# Altium integrated library CapacitorElectrolytic.IntLib: 76 symbols
Pins are listed as number, name and electrical type; pins without a type are passive.

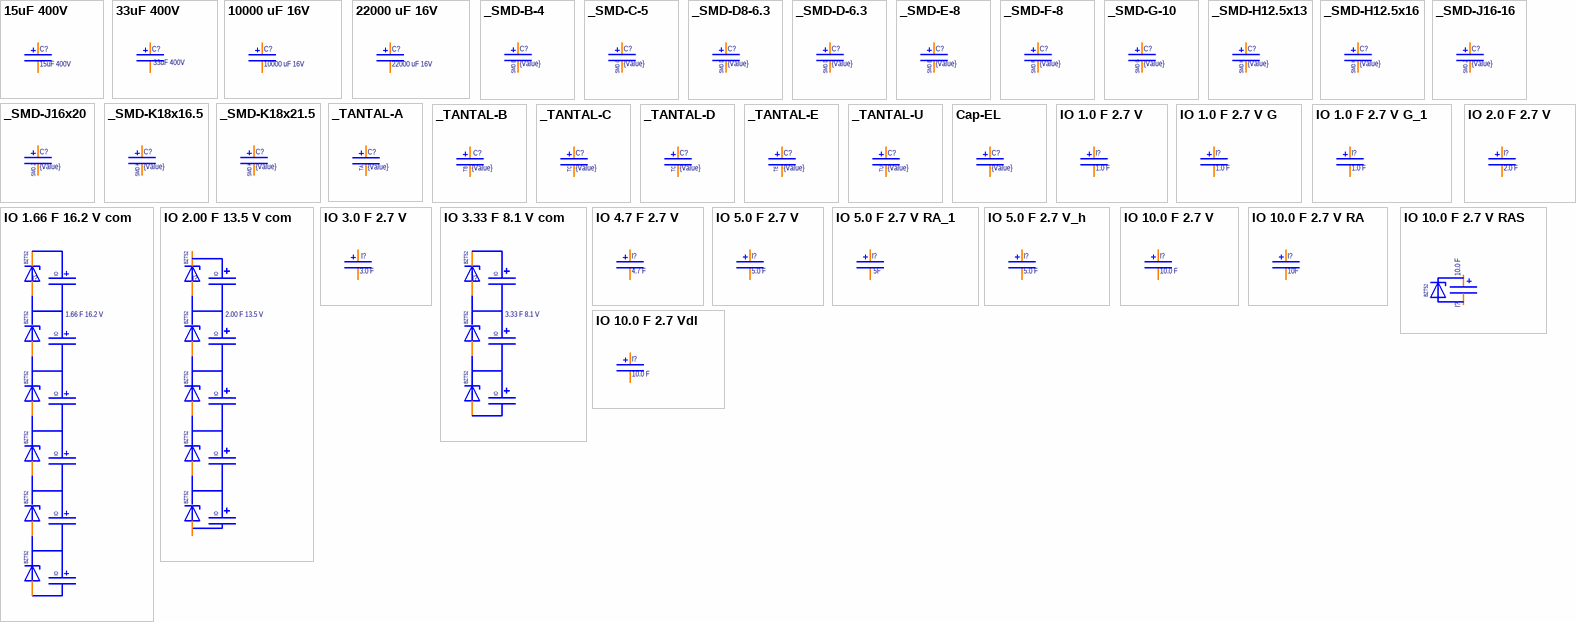
[diagram p0: symbols 15uF 400V to IO 10.0 F 2.7 Vdl]

## 15uF 400V
designator C?
10x16mm; Manufacturer: Guangdong TOPAZ Elec Tech; Manufacturer PartNumber: ECRE1016150M401P00; Temp.Characteristic: –55 °C to +105 °C; Tolerance: ±20 %; Note: Aluminum Electrolytic Capacitors; Detailed Description: Aluminum Electrolytic Capacitors - Leaded 15uF ±20% 400V Radial,10x16mm RoHS; Lifetime @ Temp: 2000Hrs@105℃; Package / Case: Radial,10x16mm; Publisher: Catcatcat Electronics; Voltage: 400V; HelpURL: https://datasheet.lcsc.com/szlcsc/Guangdong-TOPAZ-Elec-Tech-ECRE1016150M401P00_C156864.pdf; website developer: http://catcatcat.d-lan.dp.ua/; Dealer LCSC: https://lcsc.com/product-detail/Aluminum-Electrolytic-Capacitors-Leaded_Guangdong-TOPAZ-Elec-Tech-ECRE1016150M401P00_C156864.html; PartNumber LCSC: C156864; Pricing LCSC: 0.0854; Assembly type: Manual Part; Value: 15uF 400V
footprint Cap-EL(10x20_5-5)h
footprint Cap-EL(10x16.5_5-5)T
pins: 1, 2

## 33uF 400V
designator C?
13x25mm; Manufacturer: Hao Yin Electronic Technology Co., Ltd. (HY); Pricing Аlternative: 0.2695; Temp.Characteristic: –55 °C to +105 °C; Tolerance: ±20 %; Note: Aluminum Electrolytic Capacitors; Detailed Description: Aluminum Electrolytic Capacitors - Leaded 15uF ±20% 400V Radial,10x16mm RoHS; Lifetime @ Temp: 10000Hrs@105℃; Dealer Аlternative: https://voron.ua/catalog/025940--kondensator_hl_33uf_400v_1325_105c_10000hr_long_life_hy_hao_yin_electronic_techn; Package / Case: Radial,10x16mm; Publisher: Catcatcat Electronics; Voltage: 400V; website developer: http://catcatcat.d-lan.dp.ua/; Assembly type: Manual Part; PartNumber Аlternative: PartNumber Аlternative; Value: 33uF 400V
footprint Cap-EL(13x25-5)T
pins: 1, 2

## 10000 uF 16V
designator C?, comment value 10000 uF 16V  (hidden comment: 10000uFx16V)
18 x 35 mm; Temp.Characteristic: –55 °C to +105 °C; Tolerance: ±20 %; Voltage: 16 V; Note: Aluminum Electrolytic Capacitors; Lifetime @ Temp: 2000Hrs@105℃; Package / Case: 18 x 35 mm; Pricing Digi-Key: 1.07; Publisher: Catcatcat Electronics; website developer: http://catcatcat.d-lan.dp.ua/; Assembly type: Manual Part
footprint Cap-EL(18x35-7_5)
pins: 1, 2

## 22000 uF 16V
designator C?, comment value 22000 uF 16V  (hidden comment: 22000uFx16V)
22 x 40 mm; Temp.Characteristic: –55 °C to +105 °C; Tolerance: ±20 %; Voltage: 16 V; Note: Aluminum Electrolytic Capacitors; Lifetime @ Temp: 2000Hrs@105℃; Package / Case: 22 x 40 mm; Pricing Digi-Key: 1.07; Publisher: Catcatcat Electronics; website developer: http://catcatcat.d-lan.dp.ua/; Assembly type: Manual Part
footprint Cap-EL(22x40-10)
pins: 1, 2

## _SMD-B-4
designator C?  value {Value}  (hidden comment: *)
4x4.5, 5.3, 5.7, 5.8; Note: Aluminum Electrolytic Capacitors; Lifetime @ Temp: 2000Hrs@105℃; Publisher: Catcatcat Electronics; website developer: http://catcatcat.d-lan.dp.ua/; Assembly type: Manual Part
footprint SMD-B-4 (4?4.5, 5.3, 5.7, 5.8)
pins: 1, 2
text: SMD B

## _SMD-C-5
designator C?  value {Value}  (hidden comment: *)
5x4.0, 4.5, 5.3, 5.7, 5.8; Note: Aluminum Electrolytic Capacitors; Lifetime @ Temp: 2000Hrs@105℃; Publisher: Catcatcat Electronics; website developer: http://catcatcat.d-lan.dp.ua/; Assembly type: Manual Part
footprint SMD-C-5 (5?4.0, 4.5, 5.3, 5.7, 5.8)
pins: 1, 2
text: SMD C

## _SMD-D8-6.3
designator C?  value {Value}  (hidden comment: *)
6.3x7.7; Note: Aluminum Electrolytic Capacitors; Lifetime @ Temp: 2000Hrs@105℃; Publisher: Catcatcat Electronics; website developer: http://catcatcat.d-lan.dp.ua/; Assembly type: Manual Part
footprint SMD-D-6.3 (6.3?4.5, 5.3, 5.7, 5.8, 7.7)
pins: 1, 2
text: SMD D

## _SMD-D-6.3
designator C?  value {Value}  (hidden comment: *)
6.3x4.5, 5.3, 5.7, 5.8, 7.7; Note: Aluminum Electrolytic Capacitors; Lifetime @ Temp: 2000Hrs@105℃; Package / Case: SMD,6.3x5.4mm; Publisher: Catcatcat Electronics; website developer: http://catcatcat.d-lan.dp.ua/; Assembly type: Manual Part
footprint SMD-D-6.3 (6.3?4.5, 5.3, 5.7, 5.8, 7.7)
pins: 1, 2
text: SMD D

## _SMD-E-8
designator C?  value {Value}  (hidden comment: *)
8x6.5, 6.7, 7.7, 8.7; Note: Aluminum Electrolytic Capacitors; Lifetime @ Temp: 2000Hrs@105℃; Publisher: Catcatcat Electronics; website developer: http://catcatcat.d-lan.dp.ua/; Assembly type: Manual Part
footprint SMD-E-8X6.2 (8X6.5, 6.7, 7.7, 8.7, 10, 10.5)
pins: 1, 2
text: SMD E

## _SMD-F-8
designator C?  value {Value}  (hidden comment: *)
8x10, 10.5; Note: Aluminum Electrolytic Capacitors; Lifetime @ Temp: 2000Hrs@105℃; Publisher: Catcatcat Electronics; website developer: http://catcatcat.d-lan.dp.ua/; Assembly type: Manual Part
footprint SMD-F-8X10.2 (8X6.5, 6.7, 7.7, 8.7, 10, 10.5)
pins: 1, 2
text: SMD F

## _SMD-G-10
designator C?  value {Value}  (hidden comment: *)
10x7.7, 8.7, 10, 10.5, 12.5; Note: Aluminum Electrolytic Capacitors; Lifetime @ Temp: 2000Hrs@105℃; Publisher: Catcatcat Electronics; website developer: http://catcatcat.d-lan.dp.ua/; Assembly type: Manual Part
footprint SMD-G-10X10.2 (10X7.7, 8.7, 10, 10.5, 12.5)
pins: 1, 2
text: SMD G

## _SMD-H12.5x13
designator C?  value {Value}  (hidden comment: *)
12.5x13; Note: Aluminum Electrolytic Capacitors; Lifetime @ Temp: 2000Hrs@105℃; Publisher: Catcatcat Electronics; website developer: http://catcatcat.d-lan.dp.ua/; Assembly type: Manual Part
footprint SMD-H-12.5X13 (12.5X13.5)
pins: 1, 2
text: SMD H

## _SMD-H12.5x16
designator C?  value {Value}  (hidden comment: *)
12.5x16; Note: Aluminum Electrolytic Capacitors; Lifetime @ Temp: 2000Hrs@105℃; Publisher: Catcatcat Electronics; website developer: http://catcatcat.d-lan.dp.ua/; Assembly type: Manual Part
footprint SMD-H-12.5X16 (12.5X13.5)
pins: 1, 2
text: SMD H

## _SMD-J16-16
designator C?  value {Value}  (hidden comment: *)
16x16; Note: Aluminum Electrolytic Capacitors; Lifetime @ Temp: 2000Hrs@105℃; Publisher: Catcatcat Electronics; website developer: http://catcatcat.d-lan.dp.ua/; Assembly type: Manual Part
footprint SMD-J-16X16.5 (16X16.5)
pins: 1, 2
text: SMD J

## _SMD-J16x20
designator C?  value {Value}  (hidden comment: *)
16x20; Note: Aluminum Electrolytic Capacitors; Lifetime @ Temp: 2000Hrs@105℃; Publisher: Catcatcat Electronics; website developer: http://catcatcat.d-lan.dp.ua/; Assembly type: Manual Part
footprint SMD-J-16X20 (16X16.5)
pins: 1, 2
text: SMD J

## _SMD-K18x16.5
designator C?  value {Value}  (hidden comment: *)
18x16.5; Note: Aluminum Electrolytic Capacitors; Lifetime @ Temp: 2000Hrs@105℃; Publisher: Catcatcat Electronics; website developer: http://catcatcat.d-lan.dp.ua/; Assembly type: Manual Part
footprint SMD-K-18X16.5 (18X16.5)
pins: 1, 2
text: SMD K

## _SMD-K18x21.5
designator C?  value {Value}  (hidden comment: *)
18x21.5; Note: Aluminum Electrolytic Capacitors; Lifetime @ Temp: 2000Hrs@105℃; Publisher: Catcatcat Electronics; website developer: http://catcatcat.d-lan.dp.ua/; Assembly type: Manual Part
footprint SMD-K-18X21.5 (18X16.5)
pins: 1, 2
text: SMD K

## _TANTAL-A
designator C?, comment value {Value}  (hidden comment: uF ±10%)
Tolerance: ±20 %; Voltage: 6.3 Vdc; Note: Tantalum Capacitors; Lifetime @ Temp: 2000Hrs@105℃; ComponentLink1URL: http://www.samsungsem.com/global/support/product-search/index.jsp#; Package / Case: 2012 (0806) 3.2 x 1.6; Publisher: Catcatcat Electronics; website developer: http://catcatcat.d-lan.dp.ua/; Operating Temperature: -55℃~+125℃; Assembly type: Manual Part
footprint TANTAL_A
pins: 1, 2
text: TA

## _TANTAL-B
designator C?  value {Value}  (hidden comment: *)
Note: Tantalum Capacitors; Lifetime @ Temp: 2000Hrs@105℃; Publisher: Catcatcat Electronics; website developer: http://catcatcat.d-lan.dp.ua/; Assembly type: Manual Part
footprint TANTAL_B
pins: 1, 2
text: TB

## _TANTAL-C
designator C?  value {Value}  (hidden comment: *)
Note: Tantalum Capacitors; Lifetime @ Temp: 2000Hrs@105℃; Publisher: Catcatcat Electronics; website developer: http://catcatcat.d-lan.dp.ua/; Assembly type: Manual Part
footprint TANTAL_C
pins: 1, 2
text: TC

## _TANTAL-D
designator C?  value {Value}  (hidden comment: *)
Note: Tantalum Capacitors; Lifetime @ Temp: 2000Hrs@105℃; Publisher: Catcatcat Electronics; website developer: http://catcatcat.d-lan.dp.ua/; Assembly type: Manual Part
footprint TANTAL_D
pins: 1, 2
text: TC

## _TANTAL-E
designator C?  value {Value}  (hidden comment: *)
Note: Tantalum Capacitors; Lifetime @ Temp: 2000Hrs@105℃; Publisher: Catcatcat Electronics; website developer: http://catcatcat.d-lan.dp.ua/; Assembly type: Manual Part
footprint TANTAL_E
pins: 1, 2
text: TE

## _TANTAL-U
designator C?  value {Value}  (hidden comment: *)
Note: Tantalum Capacitors; Lifetime @ Temp: 2000Hrs@105℃; Publisher: Catcatcat Electronics; website developer: http://catcatcat.d-lan.dp.ua/; Assembly type: Manual Part
footprint TANTAL_U
pins: 1, 2
text: TU

## Cap-EL
designator C?  value {Value}  (hidden comment: *)
Note: Aluminum Electrolytic Capacitors; Lifetime @ Temp: 2000Hrs@105℃; Publisher: Catcatcat Electronics; website developer: http://catcatcat.d-lan.dp.ua/; Assembly type: Manual Part
footprint Cap-EL(4x6-1_5)T
footprint Cap-EL(6_3x11-2_5)
footprint Cap-EL(6_3x12-2_5)
footprint Cap-EL(8x11_5-3_5)
footprint Cap-EL(10x12-5)T
footprint Cap-EL(10x13_5-5)T
footprint Cap-EL(16x26-7_5)
footprint Cap-EL(13x25-5)T
footprint Cap-EL(18x25-7_5)
footprint Cap-EL(25x18-9)
pins: 1, 2

## IO 1.0 F 2.7 V
designator I?, comment value 1.0 F  (hidden comment: 1.0Fx2.7V)
8 x 13 mm; Temp.Characteristic: –55 °C to +105 °C; Tolerance: ±20 %; Voltage: 2.7 V; Note: Supercapacitor; Lifetime @ Temp: 2000Hrs@105℃; Package / Case: 8 x 13 mm; Pricing Digi-Key: 0.286; Publisher: Catcatcat Electronics; website developer: http://catcatcat.d-lan.dp.ua/; Assembly type: Manual Part
footprint Cap-EL(8x14-3_5)
pins: 1, 2

## IO 1.0 F 2.7 V G
designator I?, comment value 1.0 F  (hidden comment: 1.0Fx2.7V)
8 x 13 mm; Temp.Characteristic: –55 °C to +105 °C; Tolerance: ±20 %; Voltage: 2.7 V; Note: Supercapacitor; Lifetime @ Temp: 2000Hrs@105℃; Package / Case: 8 x 13 mm; Pricing Digi-Key: 0.286; Publisher: Catcatcat Electronics; website developer: http://catcatcat.d-lan.dp.ua/; Assembly type: Manual Part
footprint Cap-EL_G_(8.0x11.5-3.5)
pins: 1, 2

## IO 1.0 F 2.7 V G_1
designator I?, comment value 1.0 F  (hidden comment: 1.0Fx2.7V)
8 x 14 mm; Temp.Characteristic: –55 °C to +105 °C; Tolerance: ±20 %; Voltage: 2.7 V; Note: Supercapacitor; Lifetime @ Temp: 2000Hrs@105℃; Package / Case: 8 x 13 mm; Pricing Digi-Key: 0.286; Publisher: Catcatcat Electronics; website developer: http://catcatcat.d-lan.dp.ua/; Assembly type: Manual Part
footprint Cap-EL_G_(8.0x14.5-3.5) - REVERS
pins: 1, 2

## IO 1.66 F 16.2 V com
designator I?  value 1.66 F 16.2 V  (hidden comment: *)
3*3-10 x 30 mm; Temp.Characteristic: –55 °C to +105 °C; Tolerance: ±20 %; Voltage: 2.7 V; Note: Supercapacitor; Lifetime @ Temp: 2000Hrs@105℃; Package / Case: 10 x 26 mm; Pricing Digi-Key: 0.638; Publisher: Catcatcat Electronics; website developer: http://catcatcat.d-lan.dp.ua/; Assembly type: Manual Part
footprint IO 1.66 F 16.2 V com
pins: 1, 2, 3, 4, 5, 6, 7
text: BZT52; IO

## IO 2.0 F 2.7 V
designator I?, comment value 2.0 F  (hidden comment: 2.0Fx2.7V)
8 x 13 mm; Temp.Characteristic: –55 °C to +105 °C; Tolerance: ±20 %; Voltage: 2.7 V; Note: Supercapacitor; Lifetime @ Temp: 2000Hrs@105℃; Package / Case: 8 x 13 mm; Pricing Digi-Key: 0.319; Publisher: Catcatcat Electronics; website developer: http://catcatcat.d-lan.dp.ua/; Assembly type: Manual Part
footprint Cap-EL(8x14-3_5)
pins: 1, 2

## IO 2.00 F 13.5 V com
designator I?  value 2.00 F 13.5 V  (hidden comment: *)
3*3-10 x 30 mm; Temp.Characteristic: –55 °C to +105 °C; Tolerance: ±20 %; Voltage: 2.7 V; Note: Supercapacitor; Lifetime @ Temp: 2000Hrs@105℃; Package / Case: 10 x 26 mm; Pricing Digi-Key: 0.638; Publisher: Catcatcat Electronics; website developer: http://catcatcat.d-lan.dp.ua/; Assembly type: Manual Part
footprint IO 2.0 F 13.5 V com
pins: 1, 2, 3, 4, 5, 6
text: BZT52; IO

## IO 3.0 F 2.7 V
designator I?, comment value 3.0 F  (hidden comment: 3.0Fx2.7V)
8 x 20 mm; Temp.Characteristic: –55 °C to +105 °C; Tolerance: ±20 %; Voltage: 2.7 V; Note: Supercapacitor; Lifetime @ Temp: 2000Hrs@105℃; Package / Case: 8 x 20 mm; Pricing Digi-Key: 0.3575; Publisher: Catcatcat Electronics; website developer: http://catcatcat.d-lan.dp.ua/; Assembly type: Manual Part
footprint Cap-EL(8x16-3_5)
pins: 1, 2

## IO 3.33 F 8.1 V com
designator I?  value 3.33 F 8.1 V  (hidden comment: *)
3*3-10 x 30 mm; Temp.Characteristic: –55 °C to +105 °C; Tolerance: ±20 %; Voltage: 2.7 V; Note: Supercapacitor; Lifetime @ Temp: 2000Hrs@105℃; Package / Case: 10 x 26 mm; Pricing Digi-Key: 0.638; Publisher: Catcatcat Electronics; website developer: http://catcatcat.d-lan.dp.ua/; Assembly type: Manual Part
footprint IO 3.33 F 8.1 V com
pins: 1, 2, 3, 4
text: BZT52; IO

## IO 4.7 F 2.7 V
designator I?  value 4.7 F  (hidden comment: *)
10 x 20 mm; Temp.Characteristic: –55 °C to +105 °C; Tolerance: ±20 %; Voltage: 2.7 V; Note: Supercapacitor; Lifetime @ Temp: 2000Hrs@105℃; Package / Case: 10 x 20 mm; Pricing Digi-Key: 0.39; Publisher: Catcatcat Electronics; website developer: http://catcatcat.d-lan.dp.ua/; Assembly type: Manual Part
footprint Cap-EL(10x20_5-5)
pins: 1, 2

## IO 5.0 F 2.7 V
designator I?  value 5.0 F  (hidden comment: *)
10 x 21 mm,PowerStar,SeriesHV; Pricing Аlternative: 0.29; Temp.Characteristic: –55 °C to +105 °C; Tolerance: ±20 %; Voltage: 2.7 V; Note: szkfd1@qq.com(344353244), http://344353244.qzone.qq.com,; Lifetime @ Temp: 2000Hrs@105℃; Dealer Digi-Key: https://detail.1688.com/offer/1191580488.html; Package / Case: 10 x 20 mm; Publisher: Catcatcat Electronics; website developer: http://catcatcat.d-lan.dp.ua/; Assembly type: Manual Part
footprint Cap-EL(10x20_5-5)
pins: 1, 2

## IO 5.0 F 2.7 V RA_1
designator I?  value 5F  (hidden comment: *)
AVX 5F -10% +30% 2.7V T/H; Manufacturer: AVX Corporation; Manufacturer PartNumber: SCCS20B505PRB; Temp.Characteristic: -40°C ~ 65°C; Tolerance: -10%, +30%; Note: Supercapacitor; Detailed Description: 5F (EDLC) Supercapacitor 2.7V Radial, Can 70 mOhm @ 1kHz 1000 Hrs @ 60°C; Lifetime @ Temp: 2000Hrs@105℃; Package / Case: 10 x 26 mm; Pricing Digi-Key: 2.28000; Publisher: Catcatcat Electronics; Voltage: 2.7 V; HelpURL: http://datasheets.avx.com/AVX-SCC-LE.pdf; website developer: http://catcatcat.d-lan.dp.ua/; PartNumber Digi-Key: SCCS20B505PRB; Assembly type: Manual Part
footprint Cap-EL(10x20_5-5)h
pins: 1, 2

## IO 5.0 F 2.7 V_h
designator I?  value 5.0 F  (hidden comment: *)
10 x 21 mm,PowerStar,SeriesHV; Pricing Аlternative: 0.29; Temp.Characteristic: –55 °C to +105 °C; Tolerance: ±20 %; Voltage: 2.7 V; Note: szkfd1@qq.com(344353244), http://344353244.qzone.qq.com,; Lifetime @ Temp: 2000Hrs@105℃; Dealer Digi-Key: https://detail.1688.com/offer/1191580488.html; Package / Case: 10 x 20 mm; Publisher: Catcatcat Electronics; website developer: http://catcatcat.d-lan.dp.ua/; Assembly type: Manual Part
footprint Cap-EL(10x20_5-5)h
pins: 1, 2

## IO 10.0 F 2.7 V
designator I?  value 10.0 F  (hidden comment: *)
10 x 26 mm; Temp.Characteristic: –55 °C to +105 °C; Tolerance: ±20 %; Voltage: 2.7 V; Note: Supercapacitor; Lifetime @ Temp: 2000Hrs@105℃; Package / Case: 10 x 26 mm; Pricing Digi-Key: 0.638; Publisher: Catcatcat Electronics; website developer: http://catcatcat.d-lan.dp.ua/; Assembly type: Manual Part
footprint Cap-EL(10x25_5-5)
pins: 1, 2

## IO 10.0 F 2.7 V RA
designator I?  value 10F  (hidden comment: *)
AVX 10F -10% +30% 2.7V T/H; Manufacturer: AVX Corporation; Manufacturer PartNumber: SCCT20B106PRB; Temp.Characteristic: -40°C ~ 65°C; Tolerance: -10%, +30%; Note: Supercapacitor; Detailed Description: 10F (EDLC) Supercapacitor 2.7V Radial, Can 50 mOhm @ 1kHz 1000 Hrs @ 60°C; Lifetime @ Temp: 2000Hrs@105℃; Package / Case: 10 x 26 mm; Pricing Digi-Key: 3.26000; Publisher: Catcatcat Electronics; Voltage: 2.7 V; HelpURL: http://datasheets.avx.com/AVX-SCC.pdf; website developer: http://catcatcat.d-lan.dp.ua/; PartNumber Digi-Key: SCCT20B106PRB; Assembly type: Manual Part
footprint Cap-EL(12.5x20.0x5.00)RA
pins: 1, 2

## IO 10.0 F 2.7 V RAS
designator I?  value 10.0 F  (hidden comment: *)
12.5 x 20 mm; Temp.Characteristic: –55 °C to +105 °C; Tolerance: ±20 %; Voltage: 2.7 V; Note: Supercapacitor; Lifetime @ Temp: 2000Hrs@105℃; Package / Case: 10 x 26 mm; Pricing Digi-Key: 0.638; Publisher: Catcatcat Electronics; website developer: http://catcatcat.d-lan.dp.ua/; Assembly type: Manual Part
footprint Cap-EL(12.5x20.50x5.00)h
footprint Cap-EL(12.5x20.50x5.00)h R
pins: 1, 2
text: BZT52

## IO 10.0 F 2.7 Vdl
designator I?  value 10.0 F  (hidden comment: *)
10 x 30 mm; Temp.Characteristic: –55 °C to +105 °C; Tolerance: ±20 %; Voltage: 2.7 V; Note: Supercapacitor; Lifetime @ Temp: 2000Hrs@105℃; Package / Case: 10 x 26 mm; Pricing Digi-Key: 0.638; Publisher: Catcatcat Electronics; website developer: http://catcatcat.d-lan.dp.ua/; Assembly type: Manual Part
footprint Cap-EL(10x30_5-5)h
pins: 1, 2

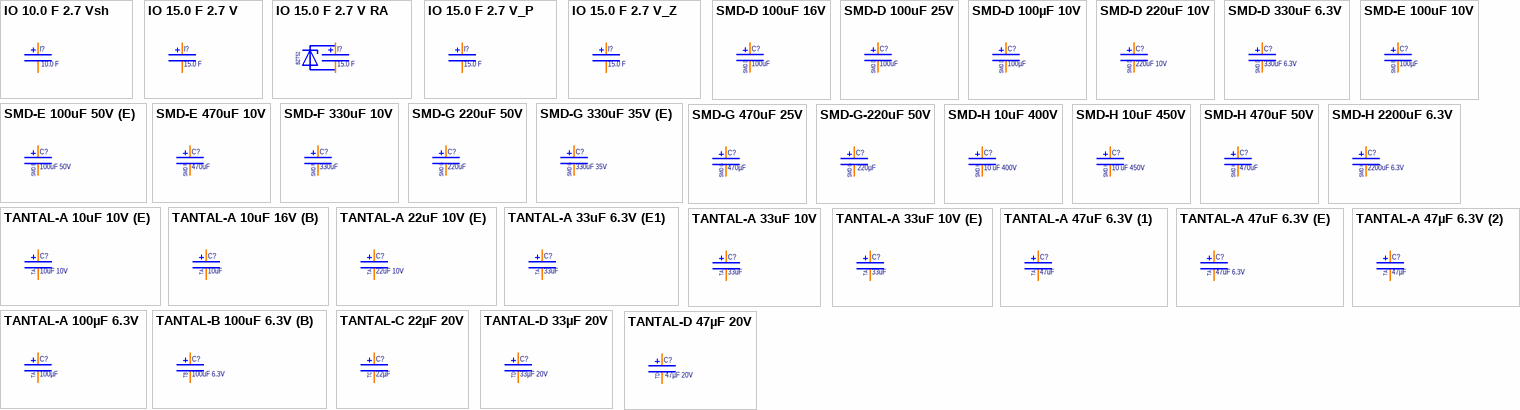
[diagram p1: symbols IO 10.0 F 2.7 Vsh to TANTAL-D 47µF 20V]

## IO 10.0 F 2.7 Vsh
designator I?  value 10.0 F  (hidden comment: *)
12.5 x 20 mm; Temp.Characteristic: –55 °C to +105 °C; Tolerance: ±20 %; Voltage: 2.7 V; Note: Supercapacitor; Lifetime @ Temp: 2000Hrs@105℃; Package / Case: 10 x 26 mm; Pricing Digi-Key: 0.638; Publisher: Catcatcat Electronics; website developer: http://catcatcat.d-lan.dp.ua/; Assembly type: Manual Part
footprint Cap-EL(12.5x20-5)
pins: 1, 2

## IO 15.0 F 2.7 V
designator I?  value 15.0 F  (hidden comment: *)
12.5 x 27 mm; Temp.Characteristic: –55 °C to +105 °C; Tolerance: ±20 %; Voltage: 2.7 V; Note: Supercapacitor; Lifetime @ Temp: 2000Hrs@105℃; Package / Case: 12.5 x 27 mm; Pricing Digi-Key: 0.781; website developer: http://catcatcat.d-lan.dp.ua/; Assembly type: Manual Part; Publisher: Catcatcat Electronics
footprint Cap-EL(12.5x25-5)
pins: 1, 2

## IO 15.0 F 2.7 V RA
designator I?  value 15.0 F  (hidden comment: *)
12.5 x 20 mm; Temp.Characteristic: –55 °C to +105 °C; Tolerance: ±20 %; Voltage: 2.7 V; Note: Supercapacitor; Lifetime @ Temp: 2000Hrs@105℃; Package / Case: 10 x 26 mm; Pricing Digi-Key: 0.638; Publisher: Catcatcat Electronics; website developer: http://catcatcat.d-lan.dp.ua/; Assembly type: Manual Part
footprint Cap-EL(12.5x20.50x5.00)h
footprint Cap-EL(12.5x20.50x5.00)h R
pins: 1, 2
text: BZT52

## IO 15.0 F 2.7 V_P
designator I?  value 15.0 F  (hidden comment: *)
13 x 27 mm,PowerStar,SeriesHV; Pricing Аlternative: 0.44; Temp.Characteristic: –55 °C to +105 °C; Tolerance: ±20 %; Voltage: 2.7 V; Note: szkfd1@qq.com(344353244),http://344353244.qzone.qq.com,344353244@qq.com; Lifetime @ Temp: 2000Hrs@105℃; Dealer Аlternative: https://detail.1688.com/offer/1191580488.html; Package / Case: 12.5 x 27 mm; Pricing Digi-Key: 0.781; Publisher: Catcatcat Electronics; website developer: http://catcatcat.d-lan.dp.ua/; Assembly type: Manual Part
footprint Cap-EL(12.5x25-5)
pins: 1, 2

## IO 15.0 F 2.7 V_Z
designator I?  value 15.0 F  (hidden comment: *)
13 x 29 mm,PowerStar,SeriesHV; Pricing Аlternative: 0.44; Temp.Characteristic: –55 °C to +105 °C; Tolerance: ±20 %; Voltage: 2.7 V; Note: szkfd1@qq.com(344353244),http://344353244.qzone.qq.com,344353244@qq.com; Lifetime @ Temp: 2000Hrs@105℃; Dealer Аlternative: https://detail.1688.com/offer/1191580488.html; Package / Case: 13.0 x 29 mm; Pricing Digi-Key: 0.781; Publisher: Catcatcat Electronics; website developer: http://catcatcat.d-lan.dp.ua/; Assembly type: Manual Part
footprint Cap-EL(13x29-5)T
pins: 1, 2

## SMD-D 100uF 16V
designator C?, comment value 100uF  (hidden comment: 100uF 16V)
6.3x5.4mm 2000Hrs@105℃; Manufacturer: ROQANG; Manufacturer PartNumber: RT1C101M0605; Tolerance: ±20%; Note: Aluminum Electrolytic Capacitors; Detailed Description: Aluminum Electrolytic Capacitors - SMD 100uF ±20% 16V SMD,6.3x5.4mm RoHS; Package / Case: SMD,6.3x5.4mm; Publisher: Catcatcat Electronics; Voltage: 16V; HelpURL: https://datasheet.lcsc.com/szlcsc/ROQANG-RT1C101M0605_C267461.pdf; website developer: http://catcatcat.d-lan.dp.ua/; Dealer LCSC: https://lcsc.com/product-detail/Others_ROQANG-RT1C101M0605_C267461.html; Lifetime @ Temp: 2000Hrs@105℃; Operating Temperature: -40℃~+105℃; PartNumber LCSC: C267461; Pricing LCSC: 0.0303; Assembly type: Manual Part
footprint SMD-D-6.3 (6.3?4.5, 5.3, 5.7, 5.8, 7.7)
pins: 1, 2
text: SMD D

## SMD-D 100uF 25V
designator C?, comment value 100uF  (hidden comment: 100uF 25V)
6.3x7.7mm 4000Hrs@125℃; Manufacturer: PANASONIC; Manufacturer PartNumber: EEHZC1E101XP; Tolerance: ±20%; Note: Aluminum Electrolytic Capacitors; Detailed Description: Aluminum Electrolytic Capacitors - SMD 100uF ±20% 25V SMD,6.3x7.7mm RoHS; Package / Case: SMD,6.3x7.7mm; Publisher: Catcatcat Electronics; Voltage: 25V; HelpURL: https://datasheet.lcsc.com/szlcsc/PANASONIC-EEHZC1E101XP_C178640.pdf; website developer: http://catcatcat.d-lan.dp.ua/; Dealer LCSC: https://lcsc.com/product-detail/Aluminum-Electrolytic-Capacitors-SMD_PANASONIC-EEHZC1E101XP_C178640.html; Lifetime @ Temp: 4000Hrs@125℃; Operating Temperature: -55℃~+125℃; PartNumber LCSC: C178640; Pricing LCSC: 0.4879; Assembly type: Manual Part
footprint SMD-D-6.3 (6.3?4.5, 5.3, 5.7, 5.8, 7.7)
pins: 1, 2
text: SMD D

## SMD-D 100µF 10V
designator C?, comment value 100µF  (hidden comment: 100µF 10V)
CAP ALUM 100UF 20% 10V SMD; Manufacturer: KEMET; Manufacturer PartNumber: EDK107M010A9GAA; Temp.Characteristic: -40°C ~ 85°C; Note: Aluminum Electrolytic Capacitors; Detailed Description: 100µF 10V Aluminum Electrolytic Capacitors Radial, Can - SMD  2000 Hrs @ 85°C; Lifetime @ Temp: 2000Hrs@105℃; Dealer Digi-Key: https://www.digikey.com/product-detail/en/kemet/EDK107M010A9GAA/EDK107M010A9GAA-ND/6597387; Package / Case: D, 0.260" L x 0.260" W (6.60mm x 6.60mm); Publisher: Catcatcat Electronics; Tolerance: ±20%; Voltage: 10V; HelpURL: https://api.kemet.com/component-edge/download/datasheet/EDK107M010A9GAA.pdf; website developer: http://catcatcat.d-lan.dp.ua/; PartNumber Digi-Key: EDK107M010A9GAA; Assembly type: Manual Part
footprint SMD-D-6.3 (6.3X4.5, 5.3, 5.7, 5.8, 7.7)
pins: 1, 2
text: SMD D

## SMD-D 220uF 10V
designator C?, comment 220uF 10V
6.3x4.5, 5.3, 5.7, 5.8, 7.7; Manufacturer: Shenzhen Xin Tang Electronic Technology Co., Ltd (Xin Tang); PartNumber Аlternative: 030456; Dealer Аlternative: voron.ua; Pricing Аlternative: 0.045; Note: Aluminum Electrolytic Capacitors; Lifetime @ Temp: 2000Hrs@105℃; Package / Case: SMD,6.3x5.4mm; Publisher: Catcatcat Electronics; website developer: http://catcatcat.d-lan.dp.ua/; Assembly type: Manual Part; Value: 220uF 10V
footprint SMD-D-6.3 (6.3?4.5, 5.3, 5.7, 5.8, 7.7)
pins: 1, 2
text: SMD D

## SMD-D 330uF 6.3V
designator C?  value 330uF 6.3V  (hidden comment: *)
6.3x7.7 6V3 105C SMD; Manufacturer PartNumber: SA1 330uF 6.3V; PartNumber Аlternative: 019861; Pricing Аlternative: 0.055; Note: Aluminum Electrolytic Capacitors; Detailed Description: RVT 330uF 6V3 6*7 105C SMD; Lifetime @ Temp: 2000Hrs@105℃; Dealer Аlternative: https://voron.ua/catalog/019861--kondensator_rvt_330uf_6v3_67_105c_smd_jp_shanghai_jinpei_electronic_coltd; Package / Case: SMD,6.3x5.4mm; Publisher: Catcatcat Electronics; HelpURL: https://pdf.voron.ua/files/pdf/cap/SMD-Aluminum-Electrolytic-Capacitor-SA1.pdf; website developer: http://catcatcat.d-lan.dp.ua/; Assembly type: Manual Part
footprint SMD-D8-6.3X7.7 (6.3X4.5, 5.3, 5.7, 5.8, 7.7)
pins: 1, 2
text: SMD D

## SMD-E 100uF 10V
designator C?, comment value 100µF  (hidden comment: 100uF 10V)
8x6.5 100UF 20% 10V SMD; Manufacturer: Panasonic Electronic Components; Manufacturer PartNumber: EEE-FC1A101P; Temp.Characteristic: -40°C ~ 105°C; Note: Aluminum Electrolytic Capacitors; Detailed Description: 100µF 10V Aluminum Electrolytic Capacitors Radial, Can - SMD  1000 Hrs @ 105°C; Lifetime @ Temp: 2000Hrs@105℃; Dealer Digi-Key: https://www.digikey.com/product-detail/en/panasonic-electronic-components/EEE-FC1A101P/PCE3989TR-ND/817398; Package / Case: F, 0.327" L x 0.327" W (8.30mm x 8.30mm); Publisher: Catcatcat Electronics; Tolerance: ±20%; Voltage: 10V; HelpURL: https://industrial.panasonic.com/cdbs/www-data/pdf/RDE0000/ABA0000C1172.pdf; website developer: http://catcatcat.d-lan.dp.ua/; PartNumber Digi-Key: EEE-FC1A101P; Assembly type: Manual Part
footprint SMD-E-8X6.2 (8X6.5, 6.7, 7.7, 8.7, 10, 10.5)
pins: 1, 2
text: SMD E

## SMD-E 100uF 50V (E)
designator C?, comment value 100uF 50V  (hidden comment: 100uF 50V ±20%)
8x10 ±20%; Manufacturer: Lelon; Manufacturer PartNumber: VEJ101M1HTR-0810; Note: Aluminum Electrolytic Capacitors; Detailed Description: ALUMINUM ELECTROLYTIC CAPACITORS - SMD 100UF ±20% 50V SMD,8X10MM ROHS; Lifetime @ Temp: 2000Hrs@105℃; Package / Case: SMD-ECAP-8x10; Publisher: Catcatcat Electronics; Voltage: 50V; HelpURL: https://datasheet.lcsc.com/szlcsc/Lelon-VEJ101M1HTR-0810_C176665.pdf; website developer: http://catcatcat.d-lan.dp.ua/; PartNumber LCSC: C176665; Pricing LCSC: 0.0942; Assembly type: Extended Part
footprint SMD-E-8X6.2 (8X6.5, 6.7, 7.7, 8.7, 10, 10.5)
pins: 1, 2
text: SMD E

## SMD-E 470uF 10V
designator C?, comment value 470uF  (hidden comment: 470uF 10V)
8x10.2; Pricing Аlternative: 0.036; Temp.Characteristic: –55 °C to +105 °C; Tolerance: ±20 %; Note: Aluminum Electrolytic Capacitors; Lifetime @ Temp: 2000Hrs@105℃; Package / Case: F; Pricing Digi-Key: 0.155; Publisher: Catcatcat Electronics; Voltage: 10V; website developer: http://catcatcat.d-lan.dp.ua/; PartNumber Digi-Key: EEEFK1A471P; Assembly type: Manual Part
footprint SMD-E-8X6.2 (8X6.5, 6.7, 7.7, 8.7, 10, 10.5)
pins: 1, 2
text: SMD F

## SMD-F 330uF 10V
designator C?, comment value 330uF  (hidden comment: 330uF 10V)
8x10mm 5000Hrs @ 105℃; Manufacturer: Lelon; Manufacturer PartNumber: VZH331M1ATR-0810; Tolerance: ±20%; Note: Aluminum Electrolytic Capacitors; Marking: 330; Detailed Description: 330uF ±20% 10V SMD,8x10mm Aluminum Electrolytic Capacitors - SMD RoHS; Package / Case: SMD,8x10mm; Publisher: Catcatcat Electronics; Voltage: 10V; HelpURL: https://datasheet.lcsc.com/szlcsc/1910111742_Lelon-VZH331M1ATR-0810_C249903.pdf; website developer: http://catcatcat.d-lan.dp.ua/; Dealer LCSC: https://lcsc.com/product-detail/Others_Lelon-VZH331M1A0810-TRO_C249903.html; Lifetime @ Temp: 5000Hrs @ 105℃; Operating Temperature: -45℃ ~ +105℃; PartNumber LCSC: C249903; Pricing LCSC: 0.0935; Assembly type: Manual Part
footprint SMD-F-8X10.2 (8X6.5, 6.7, 7.7, 8.7, 10, 10.5)
pins: 1, 2
text: SMD F

## SMD-G 220uF 50V
designator C?, comment value 220uF  (hidden comment: 220uF 50V)
10x10mm 2000Hrs@105℃; Manufacturer: Lelon; Manufacturer PartNumber: VEJ221M1HTR-1010; Tolerance: ±20%; Note: Aluminum Electrolytic Capacitors; Detailed Description: Aluminum Electrolytic Capacitors - SMD 220uF ±20% 50V SMD,10x10mm RoHS; Package / Case: SMD,10x10mm; Publisher: Catcatcat Electronics; Voltage: 50V; HelpURL: https://datasheet.lcsc.com/szlcsc/Lelon-VEJ221M1HTR-1010_C176670.pdf; website developer: http://catcatcat.d-lan.dp.ua/; Dealer LCSC: https://lcsc.com/product-detail/Aluminum-Electrolytic-Capacitors-SMD_Lelon-VEJ221M1HTR-1010_C176670.html; Lifetime @ Temp: 2000Hrs@105℃; Operating Temperature: -55℃~+105℃; PartNumber LCSC: C176670; Pricing LCSC: 0.1530; Assembly type: Manual Part
footprint SMD-G-10X10.2 (10X7.7, 8.7, 10, 10.5, 12.5)
pins: 1, 2
text: SMD G

## SMD-G 330uF 35V (E)
designator C?, comment value 330uF 35V  (hidden comment: 330uF 35V ±20%)
10x7.7, 8.7, 10, 10.5, 12.5 ±20%; Manufacturer: Lelon; Manufacturer PartNumber: VZH331M1VTR-1010K; Note: Aluminum Electrolytic Capacitors; Lifetime @ Temp: 2000Hrs@105℃; Package / Case: SMD-ECAP-10x10; Publisher: Catcatcat Electronics; Tolerance: ±20%; Voltage: 35V; HelpURL: https://datasheet.lcsc.com/szlcsc/Lelon-VZH331M1VTR-1010K_C134522.pdf; website developer: http://catcatcat.d-lan.dp.ua/; PartNumber LCSC: C134522; Pricing LCSC: 0.2319; Assembly type: Manual Part
footprint SMD-G-10X10.2 (10X7.7, 8.7, 10, 10.5, 12.5)
pins: 1, 2
text: SMD G

## SMD-G 470uF 25V
designator C?, comment value 470µF  (hidden comment: 470uF 25V)
CAP ALUM 470UF 20% 25V SMD; Manufacturer: KEMET; Manufacturer PartNumber: EDH477M025A9PAA; Pricing Аlternative: 0.05; Temp.Characteristic: –55 °C to +105 °C; Note: Aluminum Electrolytic Capacitors; Detailed Description: 470µF 25V Aluminum Electrolytic Capacitors Radial, Can - SMD  2000 Hrs @ 105°C; Lifetime @ Temp: 2000Hrs@105℃; ComponentLink2URL: http://www.mouser.com/ds/2/315/ABA0000C1181-947564.pdf; Dealer Digi-Key: https://www.digikey.com/product-detail/en/kemet/EDH477M025A9PAA/EDH477M025A9PAA-ND/6597660; Dealer Аlternative: https://detail.1688.com/offer/541866342432.html; Package / Case: G, 0.394" Dia (10.00mm); Pricing Digi-Key: 0.21; Publisher: Catcatcat Electronics; Tolerance: ±20 %; Voltage: 25V; HelpURL: https://api.kemet.com/component-edge/download/datasheet/EDH477M025A9PAA.pdf; website developer: http://catcatcat.d-lan.dp.ua/; PartNumber Digi-Key: EDH477M025A9PAA; Assembly type: Manual Part
footprint SMD-G-10X10.2 (10X7.7, 8.7, 10, 10.5, 12.5)
pins: 1, 2
text: SMD G

## SMD-G-220uF 50V
designator C?, comment value 220µF  (hidden comment: 220uF 50V)
CAP ALUM 220UF 20% 50V SMD; Manufacturer: Panasonic Electronic Components; Manufacturer PartNumber: EEE-1HA221P; Temp.Characteristic: -40°C ~ 85°C; Note: Aluminum Electrolytic Capacitors; Detailed Description: 220µF 50V Aluminum Electrolytic Capacitors Radial, Can - SMD  2000 Hrs @ 85°C; Lifetime @ Temp: 2000Hrs@105℃; Dealer Digi-Key: https://www.digikey.com/product-detail/en/panasonic-electronic-components/ECE-V1HA221P/PCE3198TR-ND/273829; Package / Case: G, 0.406" L x 0.406" W (10.30mm x 10.30mm); Pricing Digi-Key: 0.65000; Publisher: Catcatcat Electronics; Tolerance: ±20%; Voltage: 50V; HelpURL: https://media.digikey.com/pdf/Data%20Sheets/Panasonic%20Electronic%20Components/S_Series_Type_V_.pdf; website developer: http://catcatcat.d-lan.dp.ua/; PartNumber Digi-Key: EEE-1HA221P; Assembly type: Manual Part
footprint SMD-G-10X10.2 (10X7.7, 8.7, 10, 10.5, 12.5)
pins: 1, 2
text: SMD G

## SMD-H 10uF 400V
designator C?, comment value 10 uF 400V  (hidden comment: 10uF 400V)
400V 10.0*12.0 105C SMD; Manufacturer: Semtech; Manufacturer PartNumber: HU2G100M-CRG12; Tolerance: ±20%; Note: Aluminum Electrolytic Capacitors; Detailed Description: Aluminum Electrolytic Capacitors - SMD 10uF ±20% 400V SMD,10x12.5mm RoHS; Lifetime @ Temp: 2000Hrs@105℃; Package / Case: SMD,10x12.5mm; Publisher: Catcatcat Electronics; Voltage: 400V; HelpURL: https://datasheet.lcsc.com/szlcsc/Semtech-HU2G100M-CRG12_C117830.pdf; website developer: http://catcatcat.d-lan.dp.ua/; Dealer LCSC: https://lcsc.com/product-detail/Aluminum-Electrolytic-Capacitors-SMD_10uF-400V_C117830.html; PartNumber LCSC: C117830; Pricing LCSC: 0.1267; Assembly type: Manual Part
footprint SMD-G-10X10.2 (10X7.7, 8.7, 10, 10.5, 12.5)
pins: 1, 2
text: SMD H

## SMD-H 10uF 450V
designator C?, comment value 10 uF 450V  (hidden comment: 10uF 450V)
450V 12.5*13.5 105C SMD; Manufacturer: Semtech; Manufacturer PartNumber: HU2G100M-CRG12; Tolerance: ±20%; Voltage: 400V; Note: Aluminum Electrolytic Capacitors; Detailed Description: Aluminum Electrolytic Capacitors - SMD 15uF ±20% 400V SMD,12.5x13.5mm RoHS; Lifetime @ Temp: 3000Hrs@105℃; Package / Case: SMD,12.5x13.5mm; Publisher: Catcatcat Electronics; HelpURL: https://datasheet.lcsc.com/szlcsc/Honor-Elec-UV2G150M1213_C88688.pdf; website developer: http://catcatcat.d-lan.dp.ua/; Dealer LCSC: https://lcsc.com/product-detail/Aluminum-Electrolytic-Capacitors-SMD_10uF-400V_C117830.html; PartNumber LCSC: C88688; Pricing LCSC: 0.2364; Assembly type: Manual Part
footprint SMD-H-12.5X13 (12.5X13.5)
pins: 1, 2
text: SMD H

## SMD-H 470uF 50V
designator C?, comment value 470uF  (hidden comment: 470uF 50V 12.5x13.5mm)
50V 12.5x13.5mm 2000Hrs@105℃; Manufacturer: ROQANG; Manufacturer PartNumber: RVT1H471M1213; Tolerance: ±20%; Note: Aluminum Electrolytic Capacitors; Detailed Description: Aluminum Electrolytic Capacitors - SMD 470uF ±20% 50V SMD,12.5x13.5mm RoHS; Package / Case: SMD,12.5x13.5mm; Publisher: Catcatcat Electronics; Voltage: 50V; HelpURL: https://datasheet.lcsc.com/szlcsc/ROQANG-RVT1H471M1213_C90272.pdf; website developer: http://catcatcat.d-lan.dp.ua/; Dealer LCSC: https://lcsc.com/product-detail/Aluminum-Electrolytic-Capacitors-SMD_470uF-50V-20_C90272.html; Lifetime @ Temp: 2000Hrs@105℃; Operating Temperature: -55℃~+105℃; PartNumber LCSC: C90272; Pricing LCSC: 0.2773; Assembly type: Manual Part
footprint SMD-H-12.5X13 (12.5X13.5)
pins: 1, 2
text: SMD H

## SMD-H 2200uF 6.3V
designator C?  value 2200uF 6.3V  (hidden comment: *)
12.5x13; Note: Aluminum Electrolytic Capacitors; Lifetime @ Temp: 2000Hrs@105℃; Publisher: Catcatcat Electronics; website developer: http://catcatcat.d-lan.dp.ua/; Assembly type: Manual Part
footprint SMD-H-12.5X13 (12.5X13.5)
pins: 1, 2
text: SMD H

## TANTAL-A 10uF 10V (E)
designator C?, comment value 10uF 10V  (hidden comment: 10uF ±10% 10V)
10uF 10V CASE-A_3216; Manufacturer: Shenzhen Zhenhua XinYun Elec; Manufacturer PartNumber: CA45-A-10V-10uF-M; Tolerance: ±20 %; Voltage: 10 Vdc; Note: Tantalum Capacitors; Detailed Description: Tantalum Capacitors 10uF 10V CASE-A_3216 RoHS; Lifetime @ Temp: 2000Hrs@105℃; ComponentLink1URL: http://www.samsungsem.com/global/support/product-search/index.jsp#; Package / Case: CASE-A_3216; Publisher: Catcatcat Electronics; HelpURL: https://datasheet.lcsc.com/szlcsc/Shenzhen-Zhenhua-Fu-Elec-CA45-A-10V-10uF-M_C128256.pdf; website developer: http://catcatcat.d-lan.dp.ua/; Operating Temperature: -55℃~+125℃; PartNumber LCSC: C128256; Pricing LCSC: 0.0879; Assembly type: Extended Part
footprint TANTAL_A
pins: 1, 2
text: TA

## TANTAL-A 10uF 16V (B)
designator C?, comment value 10uF  (hidden comment: 10uF 16V ±10%)
16V 3 Ohm @ 100KHz; Manufacturer: AVX; Manufacturer PartNumber: TAJA106K016RNJ; Voltage: 10V; Note: Tantalum Capacitors; Detailed Description: TANTALUM CAPACITORS 10UF 16V CASE-A_3216 ROHS; ComponentLink1URL: http://www.samsungsem.com/global/support/product-search/index.jsp#; Package / Case: CASE-A_3216; Publisher: Catcatcat Electronics; Tolerance: ±10%; HelpURL: https://datasheet.lcsc.com/szlcsc/AVX-TAJA106K016RNJ_C7171.pdf; website developer: http://catcatcat.d-lan.dp.ua/; Operating Temperature: -55℃~+125℃; PartNumber LCSC: C7171; Pricing LCSC: 0.0810; Assembly type: Basic Part
footprint TANTAL_A
pins: 1, 2
text: TA

## TANTAL-A 22uF 10V (E)
designator C?, comment value 22uF 10V  (hidden comment: 22uF ±10% 10V)
22uF 10V CASE-A_3216; Manufacturer: Shenzhen Zhenhua XinYun Elec; Manufacturer PartNumber: CA45-A-10V-22uF-K; Tolerance: ±20 %; Voltage: 10 Vdc; Note: Tantalum Capacitors; Detailed Description: Tantalum Capacitors 22uF 10V CASE-A_3216 RoHS; Lifetime @ Temp: 2000Hrs@105℃; ComponentLink1URL: http://www.samsungsem.com/global/support/product-search/index.jsp#; Package / Case: CASE-A_3216; Publisher: Catcatcat Electronics; HelpURL: https://datasheet.lcsc.com/szlcsc/Shenzhen-Zhenhua-Fu-Elec-CA45-A-10V-22uF-K_C129272.pdf; website developer: http://catcatcat.d-lan.dp.ua/; Operating Temperature: -55℃~+125℃; PartNumber LCSC: C129272; Pricing LCSC: 0.0849; Assembly type: Extended Part
footprint TANTAL_A
pins: 1, 2
text: TA

## TANTAL-A 33uF 6.3V (E1)
designator C?, comment value 33uF  (hidden comment: 33uF 6.3V ±10%)
6.3V 2.2 Ohm @ 100KHz; Manufacturer: Hunan Xiangyee in S&T; Manufacturer PartNumber: CA45-A6R3K336T; Note: Tantalum Capacitors; Detailed Description: TANTALUM CAPACITORS 33UF 6.3V CASE-A_3216 ROHS; ComponentLink1URL: http://www.samsungsem.com/global/support/product-search/index.jsp#; Package / Case: CASE-A_3216; Publisher: Catcatcat Electronics; Tolerance: ±10%; Voltage: 6.3V; HelpURL: https://datasheet.lcsc.com/szlcsc/Hunan-Xiangyee-in-S-T-CA45-A6R3K336T_C201137.pdf; website developer: http://catcatcat.d-lan.dp.ua/; Operating Temperature: -55℃~+125℃; PartNumber LCSC: C201137; Pricing LCSC: 0.0706; Assembly type: Extended Part
footprint TANTAL_A
pins: 1, 2
text: TA

## TANTAL-A 33uF 10V
designator C?, comment value 33uF  (hidden comment: 33uF 6.3V ±10%)
6.3V 2.2 Ohm @ 100KHz; Manufacturer: Hunan Xiangyee in S&T; Manufacturer PartNumber: CA45-A6R3K336T; Note: Tantalum Capacitors; Detailed Description: Tantalum Capacitors 33uF 6.3V CASE-A_3216 RoHS; ComponentLink1URL: http://www.samsungsem.com/global/support/product-search/index.jsp#; Package / Case: CASE-A_3216; Publisher: Catcatcat Electronics; Tolerance: ±10%; Voltage: 6.3V; HelpURL: https://datasheet.lcsc.com/szlcsc/Hunan-Xiangyee-in-S-T-CA45-A6R3K336T_C201137.pdf; website developer: http://catcatcat.d-lan.dp.ua/; Dealer LCSC: https://lcsc.com/product-detail/Tantalum-Capacitors_Hunan-Xiangyee-in-S-T-CA45-A6R3K336T_C201137.html; Operating Temperature: -55℃~+125℃; PartNumber LCSC: C201137; Pricing LCSC: 0.0738; Assembly type: Manual Part
footprint TANTAL_A
pins: 1, 2
text: TA

## TANTAL-A 33uF 10V (E)
designator C?, comment value 33uF  (hidden comment: 33uF 10V ±10%)
10V 2.2 Ohm @ 100KHz; Manufacturer: Shenzhen Zhenhua XinYun Elec; Manufacturer PartNumber: CA45-A-10V-33uF-K; Note: Tantalum Capacitors; Detailed Description: TANTALUM CAPACITORS 33UF 10V CASE-A_3216 ROHS; ComponentLink1URL: http://www.samsungsem.com/global/support/product-search/index.jsp#; Package / Case: CASE-A_3216; Publisher: Catcatcat Electronics; Tolerance: ±10%; Voltage: 10V; HelpURL: https://datasheet.lcsc.com/szlcsc/Shenzhen-Zhenhua-Fu-Elec-CA45-A-10V-33uF-K_C140402.pdf; website developer: http://catcatcat.d-lan.dp.ua/; Operating Temperature: -55℃~+125℃; PartNumber LCSC: C140402; Pricing LCSC: 0.0783; Assembly type: Extended Part
footprint TANTAL_A
pins: 1, 2
text: TA

## TANTAL-A 47uF 6.3V (1)
designator C?, comment value 47uF  (hidden comment: 47uF 6.3V)
6.3V 2.5 Ohm @ 100KHz; Manufacturer: Hunan Xiangyee in S&T; Manufacturer PartNumber: CA45-A6R3K476T; Tolerance: ±10%; Note: Tantalum Capacitors; Detailed Description: Tantalum Capacitors 47uF 6.3V CASE-A_3216 RoHS; Lifetime @ Temp: 2000Hrs@105℃; ComponentLink1URL: http://www.samsungsem.com/global/support/product-search/index.jsp#; Package / Case: CASE-A_3216; Publisher: Catcatcat Electronics; Voltage: 6.3V; HelpURL: https://datasheet.lcsc.com/szlcsc/Hunan-Xiangyee-in-S-T-CA45-A6R3K476T_C122913.pdf; website developer: http://catcatcat.d-lan.dp.ua/; Dealer LCSC: https://lcsc.com/product-detail/Tantalum-Capacitors_Hunan-Xiangyee-in-S-T-CA45-A6R3K476T_C122913.html; Operating Temperature: -55℃~+125℃; PartNumber LCSC: C122913; Pricing LCSC: 0.0671; Assembly type: Manual Part
footprint TANTAL_A
pins: 1, 2
text: TA

## TANTAL-A 47uF 6.3V (E)
designator C?, comment value 47uF 6.3V  (hidden comment: 47uF ±10% 6.3V)
47uF 6.3V CASE-A_3216; Manufacturer: Shenzhen Zhenhua XinYun Elec; Manufacturer PartNumber: CA45-A-10V-22uF-K; Tolerance: ±20 %; Voltage: 6.3 Vdc; Note: Tantalum Capacitors; Detailed Description: Tantalum Capacitors 47uF 6.3V CASE-A_3216 RoHS; Lifetime @ Temp: 2000Hrs@105℃; ComponentLink1URL: http://www.samsungsem.com/global/support/product-search/index.jsp#; Package / Case: CASE-A_3216; Publisher: Catcatcat Electronics; HelpURL: https://datasheet.lcsc.com/szlcsc/Shenzhen-Zhenhua-Fu-Elec-CA45-A-6-3V-47uF-M_C139817.pdf; website developer: http://catcatcat.d-lan.dp.ua/; Operating Temperature: -55℃~+125℃; PartNumber LCSC: C139817; Pricing LCSC: 0.1135; Assembly type: Extended Part
footprint TANTAL_A
pins: 1, 2
text: TA

## TANTAL-A 47µF 6.3V (2)
designator C?, comment value 47µF  (hidden comment: 47UF 6.3V 10%)
6.3V 1206; Manufacturer: AVX Corporation; Manufacturer PartNumber: TAJA476K006RNJ; Temp.Characteristic: -55°C ~ 125°C; Note: Tantalum Capacitors; Detailed Description: 47µF Molded Tantalum Capacitors 6.3V 1206 (3216 Metric) 1.6 Ohm; Lifetime @ Temp: 2000Hrs@105℃; ComponentLink1URL: http://www.samsungsem.com/global/support/product-search/index.jsp#; ComponentLink2URL: http://www.samsungsem.com/kr/front/downloadcms.do?path=/kr/support/product-search/tantalum/__icsFiles/afieldfile/2015/04/15&fileName=Spec%20sheet_TCPCS0J476MAAR0070.pdf; Dealer Digi-Key: https://www.digikey.com/product-detail/en/avx-corporation/TAJA476K006RNJ/478-5800-2-ND/1469571; Package / Case: A, 0.126" L x 0.063" W (3.20mm x 1.60mm); Pricing Digi-Key: 0.10892; Publisher: Catcatcat Electronics; Tolerance: ±10%; Voltage: 6.3V; HelpURL: http://datasheets.avx.com/TAJ.pdf; website developer: http://catcatcat.d-lan.dp.ua/; PartNumber Digi-Key: TAJA476K006RNJ; Assembly type: Manual Part
footprint TANTAL_A
pins: 1, 2
text: TA

## TANTAL-A 100µF 6.3V
designator C?, comment value 100µF  (hidden comment: 100µF 6.3V)
6.3V; Tolerance: ±20 %; Voltage: 6.3 Vdc; Note: Tantalum Capacitors; ComponentLink1URL: http://www.samsungsem.com/global/support/product-search/index.jsp#; ComponentLink2URL: http://www.samsungsem.com/kr/front/downloadcms.do?path=/kr/support/product-search/tantalum/__icsFiles/afieldfile/2015/04/15&fileName=Spec%20sheet_TCPCS0J107MAAR0045.pdf; Package / Case: 2012 (0806) 3.2 x 1.6; Publisher: Catcatcat Electronics; website developer: http://catcatcat.d-lan.dp.ua/; PartNumber Digi-Key: TCPCS0J107MAAR0045; Assembly type: Manual Part
footprint TANTAL_A
pins: 1, 2
text: TA

## TANTAL-B 100uF 6.3V (B)
designator C?, comment value 100uF 6.3V  (hidden comment: 100UF 6.3V CASE-B_3528)
Manufacturer PartNumber: TAJB107K006RNJ; Note: Tantalum Capacitors; Detailed Description: TANTALUM CAPACITORS 100UF 6.3V CASE-B_3528 ROHS; Lifetime @ Temp: 2000Hrs@105℃; Package / Case: CASE-B_3528; Publisher: Catcatcat Electronics; HelpURL: https://datasheet.lcsc.com/szlcsc/AVX-TAJB107K006RNJ_C16133.pdf; website developer: http://catcatcat.d-lan.dp.ua/; PartNumber LCSC: C16133; Pricing LCSC: 0.1177; Assembly type: Basic Part
footprint TANTAL_B
pins: 1, 2
text: TB

## TANTAL-C 22µF 20V
designator C?, comment value 22µF  (hidden comment: 22µFx20V)
22µF 20V 2312 (6032 Metric) 1 Ohm; Manufacturer: Vishay Sprague; Manufacturer PartNumber: TH3C226M020F1000; Temp.Characteristic: -55°C ~ 150°C; Tolerance: ±20%; Note: Tantalum Capacitors; Lifetime @ Temp: 2000Hrs@105℃; Publisher: Catcatcat Electronics; Voltage: 20V; HelpURL: http://www.vishay.com/docs/40084/th3.pdf; website developer: http://catcatcat.d-lan.dp.ua/; PartNumber Digi-Key: TH3C226M020F1000; Assembly type: Manual Part
footprint TANTAL_C
pins: 1, 2
text: TC

## TANTAL-D 33µF 20V
designator C?, comment 33µF 20V
33µF 20V 2917 (7343 Metric) 800 mOhm; Manufacturer: KEMET; Manufacturer PartNumber: T491D336M020ZT7280; Note: Tantalum Capacitors; Lifetime @ Temp: 2000Hrs@105℃; Publisher: Catcatcat Electronics; Voltage: 20V; HelpURL: https://media.digikey.com/pdf/Data%20Sheets/Kemet%20PDFs/T491D336M020ZT7280.pdf; website developer: http://catcatcat.d-lan.dp.ua/; PartNumber Digi-Key: T491D336M020ZT7280; Assembly type: Manual Part; Value: 33µF 20V
footprint TANTAL_D
pins: 1, 2
text: TD

## TANTAL-D 47µF 20V
designator C?, comment 47µF 20V
47µF 20V 2917 (7343 Metric) 900 mOhm; Manufacturer: AVX Corporation; Manufacturer PartNumber: TAJD476M020SNJ; Temp.Characteristic: -55°C ~ 125°C; Tolerance: ±20%; Note: Tantalum Capacitors; Lifetime @ Temp: 2000Hrs@105℃; Publisher: Catcatcat Electronics; Voltage: 20V; HelpURL: http://datasheets.avx.com/TAJ.pdf; website developer: http://catcatcat.d-lan.dp.ua/; PartNumber Digi-Key: TAJD476M020SNJ; Assembly type: Manual Part; Value: 47µF 20V
footprint TANTAL_D
pins: 1, 2
text: TD